# Altium footprint library Toi Library.PcbLib: 740 footprints (part 25 of 47)
Each footprint in its own frame and in the unit in brackets; x right, y up, seen from the top. Pads: shape width x height; smd on the part's side, far side on the other; paste and mask are expansions set on the pad; w line width, h text height; cw(c..) or ccw(c..) is an arc to the next point about the centre after c.
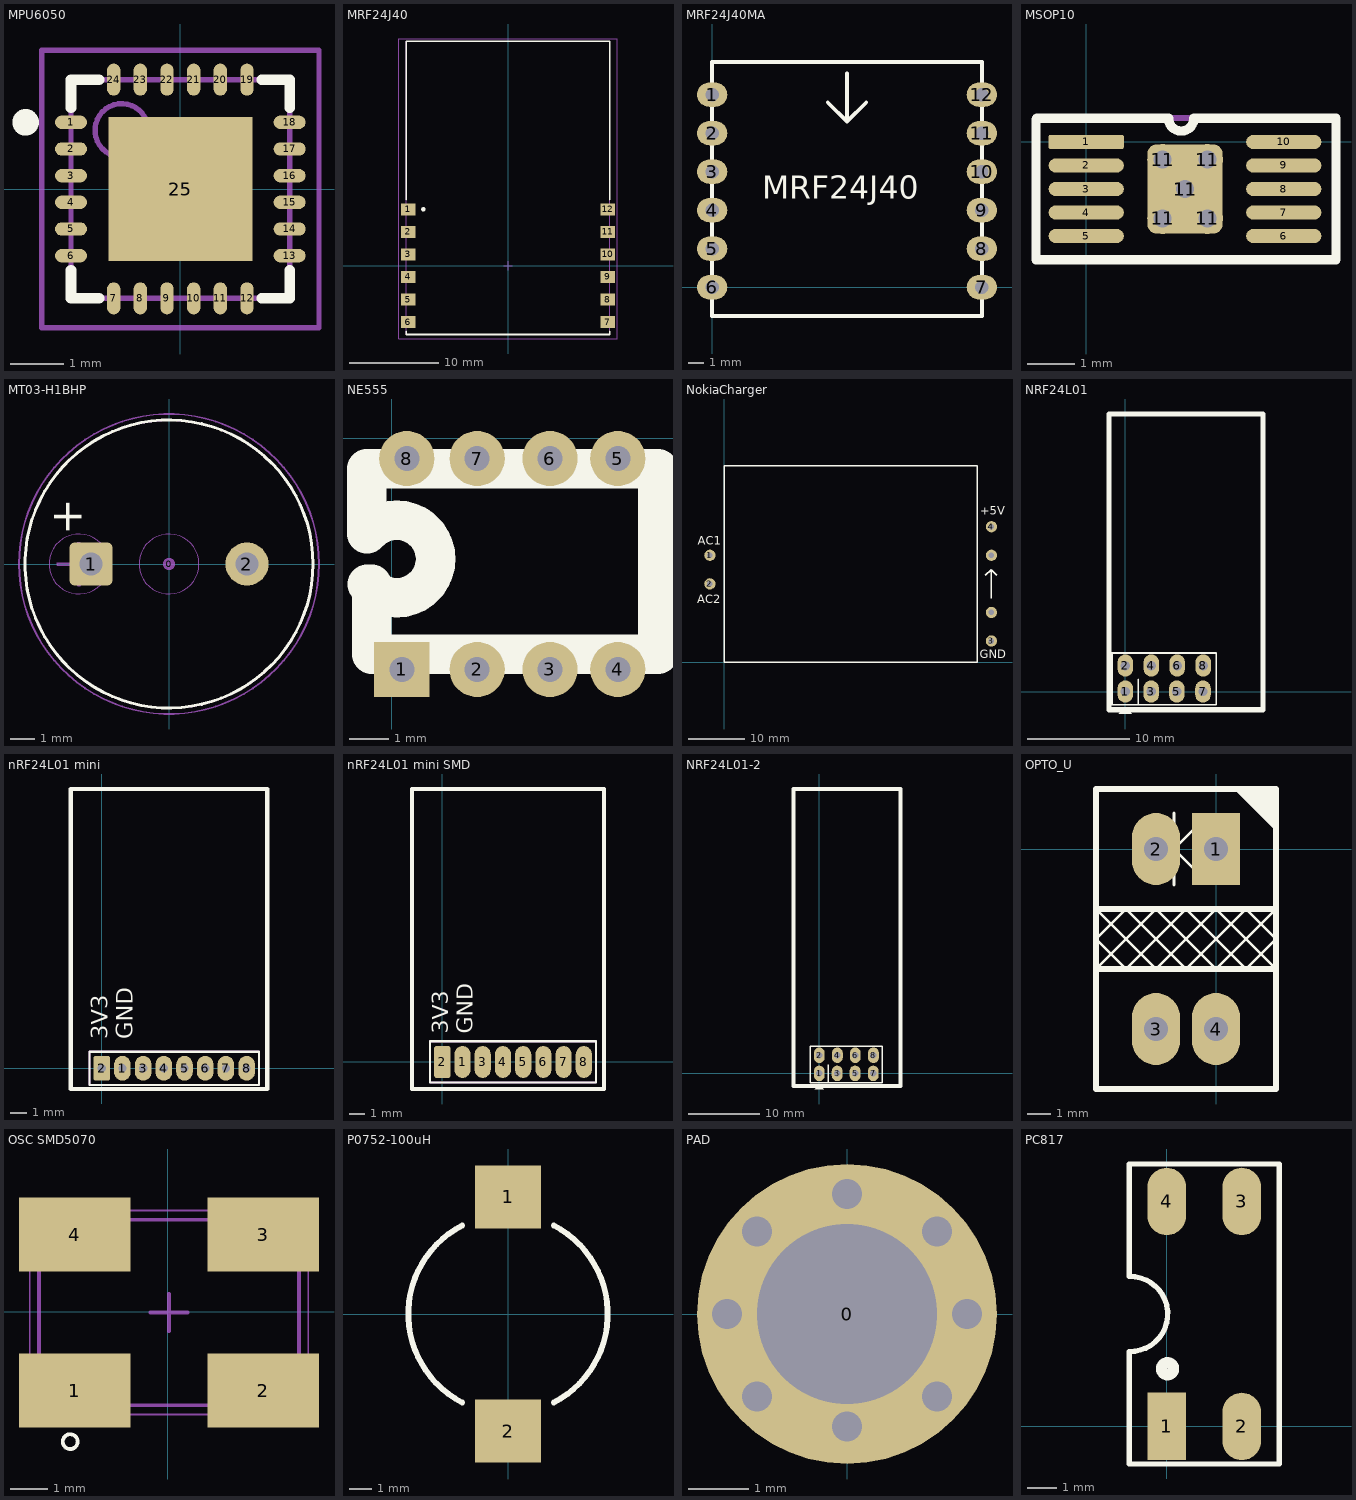
[diagram p24: the footprints below, top view; thin cyan lines are the x and y axes]

## MPU6050 [mm] "QFN-24N"
pads (25):
  oval 0.6x0.25 smd: 1(-2.05,1.25) 2(-2.05,0.75) 3(-2.05,0.25) 4(-2.05,-0.25) 5(-2.05,-0.75) 6(-2.05,-1.25) 13(2.05,-1.25) 14(2.05,-0.75) 15(2.05,-0.25) 16(2.05,0.25) 17(2.05,0.75) 18(2.05,1.25)
  oval 0.25x0.6 smd: 7(-1.25,-2.05) 8(-0.75,-2.05) 9(-0.25,-2.05) 10(0.25,-2.05) 11(0.75,-2.05) 12(1.25,-2.05) 19(1.25,2.05) 20(0.75,2.05) 21(0.25,2.05) 22(-0.25,2.05) 23(-0.75,2.05) 24(-1.25,2.05)
  rect 2.7x2.7 smd: 25(0,0)
Top Overlay:
  circle w0.25: c-2.9,1.25 r0.125
  lines w0.2: -2.05,-1.525 -2.05,-2.05 -1.525,-2.05 ; -2.05,1.525 -2.05,2.05 -1.525,2.05 ; 1.525,-2.05 2.05,-2.05 2.05,-1.525 ; 1.525,2.05 2.05,2.05 2.05,1.525
Mechanical 13:
  circle w0.1: c-1.1,1.1 r0.5
  lines w0.1: -2.05,-2.05 2.05,-2.05 2.05,2.05 -2.05,2.05 -2.05,-2.05
Mechanical 15:
  lines w0.1: -0.5,0 0.5,0 ; 0,-0.5 0,0.5 ; -2.6,-2.6 2.6,-2.6 2.6,2.6 -2.6,2.6 -2.6,-2.6
3D body "User Library-QFN24-0_5.STEP": height 1, standoff 0, extent -2,-2 2,2

## MRF24J40 [mm] "LCC, 12-Pins, Pitch 2.54mm, IPC Medium Density"
height 3.429
pads (12):
  rect 1.65x1.35 smd: 1(-11.225,6.35) 2(-11.225,3.81) 3(-11.225,1.27) 4(-11.225,-1.27) 5(-11.225,-3.81) 6(-11.225,-6.35) 7(11.225,-6.35) 8(11.225,-3.81) 9(11.225,-1.27) 10(11.225,1.27) 11(11.225,3.81) 12(11.225,6.35)
Top Overlay:
  circle w0.25: c-9.523,6.35 r0.125
  lines w0.2: -11.45,-7.425 -11.45,-7.747 11.45,-7.747 11.45,-7.425 ; -11.45,7.425 -11.45,25.273 0.195,25.273 ; -0.195,25.273 11.45,25.273 11.45,7.425
Mechanical 13:
  lines w0.1: -11.43,-7.747 -11.43,25.273 11.43,25.273 11.43,-7.747 -11.43,-7.747
Mechanical 15:
  lines w0.1: -0.5,0 0.5,0 ; 0,-0.5 0,0.5 ; -12.325,-8.255 12.325,-8.255 12.325,25.527 -12.325,25.527 -12.325,-8.255
3D body "User Library-MRF24J40MB-1.STEP": height 3.38, standoff 0.01, extent -11.43,-7.62 11.43,25.4

## MRF24J40MA [mm] "Microchip Zigbee Module"
pads (12):
  oval 2x1.6 hole 0.9: 1(0,12.7) 2(0,10.16) 3(0,7.62) 4(0,5.08) 5(0,2.54) 6(0,0) 7(17.78,0) 8(17.78,2.54) 9(17.78,5.08) 10(17.78,7.62) 11(17.78,10.16) 12(17.78,12.7)
Top Overlay:
  lines w0.254: 0,8.255 0,-1.905 ; 7.62,12.192 8.89,10.922 ; 8.89,14.097 8.89,10.922 ; 10.16,12.192 8.89,10.922 ; 0,-1.905 0,14.859 17.78,14.859 17.78,-1.905 0,-1.905
  text "MRF24J40" at 3.302,5.842 h1.52

## MSOP10 [mm]
pads (16):
  rrect25% 1.6x0.3 smd mask+0.05: 1(0,0)
  oval 1.6x0.3 smd mask+0.05: 2(0,-0.5) 3(0,-1) 4(0,-1.5) 5(0,-2) 6(4.2,-2) 7(4.2,-1.5) 8(4.2,-1) 9(4.2,-0.5) 10(4.2,0)
  round 0.66 hole 0.381: 11(1.625,-1.625) 11(1.625,-0.375) 11(2.1,-1) 11(2.575,-1.625) 11(2.575,-0.375)
  rrect25% 1.6x1.9 smd: 11(2.1,-1)
Top Overlay:
  lines w0.2: 1.725,0.5 -1.049,0.5 -1.067,0.483 -1.067,-2.5 5.309,-2.5 5.309,0.5 2.3,0.5 ; 1.75,0.5 ccw(c2.019,0.5) 2.289,0.5
Top Solder:
  rectangle: 1.175,-2.075 3.025,0.075
Mechanical 15:
  lines w0.127: -1.067,-2.489 5.309,-2.489 5.309,0.508 -1.067,0.508 -1.067,-2.489
3D body: height 1.1, standoff 0, extent 0.625,-2.5 3.625,0.525
3D body: height 0.15, standoff 0, extent -0.375,-2.125 4.6,0.125

## MT03-H1BHP [mm]
height 10.008
pads (3):
  round 0.508 on Mech15: 0(0,0)
  rrect25% 1.8x1.8 hole 0.965: 1(-3.25,0)
  round 1.8 hole 0.965: 2(3.25,0)
Top Overlay:
  circle w0.127: c0,0 r6
  text "+" at -3.2,1.2 h2.29
Mechanical 13:
  circle w0.076: c0.003,-0.012 r6
  circle w0.05: c0,0 r1.25
  circle w0.05: c0,0 r5.996
  circle w0.05: c-3.75,0 r1.25
  circle w0.05: c0,0 r6.25
  lines w0.05: -4.65,-0.05 -3.775,-0.05 ; -4.65,-0.05 -4.625,-0.025 ; -4.65,-0.05 -4.65,0.05 ; -4.65,0.05 -3.775,0.05 ; -4.65,0.05 -4.625,0.025 ; -4.625,-0.025 -3.8,-0.025 ; -4.625,-0.025 -4.625,0.025 ; -4.625,0.025 -3.8,0.025 ; -3.8,-0.9 -3.7,-0.9 ; -3.8,-0.9 -3.775,-0.875 ; -3.8,-0.9 -3.8,-0.025 ; -3.8,-0.025 cw(c-3.8,-0.05) -3.775,-0.05 ; -3.8,0.025 ccw(c-3.8,0.05) -3.775,0.05 ; -3.8,0.025 -3.8,0.9 ; -3.8,0.9 -3.775,0.875 ; -3.8,0.9 -3.7,0.9 ; -3.775,-0.875 -3.725,-0.875 ; -3.775,-0.875 -3.775,-0.05 ; -3.775,0.05 -3.775,0.875 ; -3.775,0.875 -3.725,0.875 ; -3.725,-0.875 -3.7,-0.9 ; -3.725,-0.875 -3.725,-0.05 ; -3.725,-0.05 cw(c-3.7,-0.05) -3.7,-0.025 ; -3.725,-0.05 -2.85,-0.05 ; -3.725,0.05 ccw(c-3.7,0.05) -3.7,0.025 ; -3.725,0.05 -2.85,0.05 ; -3.725,0.05 -3.725,0.875 ; -3.725,0.875 -3.7,0.9 ; -3.7,-0.9 -3.7,-0.025 ; -3.7,-0.025 -2.875,-0.025 ; -3.7,0.025 -3.7,0.9 ; -3.7,0.025 -2.875,0.025 ; -2.875,-0.025 -2.875,0.025 ; -2.875,-0.025 -2.85,-0.05 ; -2.875,0.025 -2.85,0.05 ; -2.85,-0.05 -2.85,0.05
Mechanical 15:
  circle w0.076: c0,0 r6.25
3D body: height 10, standoff -2.8, extent -6.249,-6.249 6.25,6.25

## NE555 [mm]
pads (8):
  rect 1.395x1.395 hole 0.635: 1(0.254,-5.842)
  round 1.395 hole 0.635: 2(2.159,-5.842) 3(4,-5.842) 4(5.715,-5.842) 5(5.715,-0.508) 6(4,-0.508) 7(2.159,-0.508) 8(0.381,-0.508)
Top Overlay:
  lines w1: -0.635,-2.413 -0.635,-0.762 6.731,-0.762 6.731,-1.937 6.731,-4.286 6.731,-5.461 -0.508,-5.461 -0.508,-3.683 ; -0.62,-3.683 ccw(c0.127,-3.048) -0.62,-2.413
3D body "User Library-NE55N.STEP": height 3.47, standoff -3.93, extent -0.825,-5.969 7.175,-0.398

## NokiaCharger [mm]
pads (6):
  round 2 hole 1: 1(-2.54,19.05) 2(-2.54,13.97) 3(47.54,3.81) 4(47.54,24.13) TEMP(47.54,8.89) TEMP(47.54,19.05)
Top Overlay:
  lines w0.254: 46.482,15.494 47.498,16.51 ; 47.498,11.43 47.498,16.51 ; 48.514,15.494 47.498,16.51 ; 0,0 0,35 ; 0,0 45,0 ; 0,0 45,0 ; 0,35 45,35 ; 0,35 45,35 ; 45,0 45,35
  text "GND" at 45.466,0.762 h1.52
  text "+5V" at 45.593,26.289 h1.52
  text "AC1" at -4.699,20.955 h1.52
  text "AC2" at -4.826,10.541 h1.52

## NRF24L01 [mil]
pads (8):
  oval 60x86 hole 36: 1(0,0) 2(0,100) 3(99,0) 4(100,100) 5(198,0) 6(199.5,100) 7(299,0) 8(300,100)
Top Overlay:
  region: -0.5,-61.5 -25.5,-86.5 24.5,-86.5
  lines w7: 49.5,-50.5 49.5,47.5 ; -51,-51 350,-51 350,149 -51,149 -51,49 -51,-51
  lines w20: -63,-70 530,-70 530,1069.2 -63,1069.2 -63,-70
3D body "User Library-MY-NRF24L01P.STEP": height 587.8, standoff 0.73, extent -73,-73.7 517.55,1068.03

## nRF24L01 mini [mil] "Connector; Header; 6 Position, 0.050\" pitch"
pads (8):
  oval 40x60 hole 20: 1(50,0) 3(100,0) 4(150,0) 5(200,0) 6(250,0) 7(300,0) 8(350,0)
  rrect25% 40x60 hole 20: 2(0,0)
Top Overlay:
  lines w5: -30,-40 380,-40 380,40 -30,40 -30,-40
  lines w10: -75,-50 -75,675 400,675 400,-50 -75,-50
  text "GND" at 75,70 h40
  text "3V3" at 15,70 h40
Bottom Solder:
  rectangle: 0,-30 350,30
Mechanical 13:
  lines w5: -30,-40 380,-40 380,40 -30,40 -30,-40

## nRF24L01 mini SMD [mm] "Connector; Header; 6 Position, 0.050\" pitch"
pads (8):
  oval 1.016x2 smd: 1(1.27,0) 3(2.54,0) 4(3.81,0) 5(5.08,0) 6(6.35,0) 7(7.62,0) 8(8.89,0)
  rrect25% 1.016x2 smd: 2(0,0)
Top Overlay:
  lines w0.127: -0.762,-1.3 9.652,-1.3 9.652,1.3 -0.762,1.3 -0.762,-1.3
  lines w0.254: -1.905,-1.7 -1.905,17.145 10.16,17.145 10.16,-1.7 -1.905,-1.7
  text "GND" at 1.905,1.778 h1.02
  text "3V3" at 0.381,1.778 h1.02
Bottom Solder:
  rectangle: 0,-0.762 8.89,0.762
Mechanical 13:
  lines w0.127: -0.762,-1.3 9.652,-1.3 9.652,1.3 -0.762,1.3 -0.762,-1.3

## NRF24L01-2 [mil]
pads (8):
  oval 60x86 hole 36: 1(0,0) 2(0,100) 3(99,0) 4(100,100) 5(198,0) 6(199.5,100) 7(299,0) 8(300,100)
Top Overlay:
  region: -0.5,-61.5 -25.5,-86.5 24.5,-86.5
  lines w7: 49.5,-50.5 49.5,47.5 ; -51,-51 350,-51 350,149 -51,149 -51,49 -51,-51
  lines w20: -143,-70 450,-70 450,1574.8 -143,1574.8 -143,-70

## OPTO_U [mil] "Opto hinh chu U"
height 104.33
pads (4):
  rect 80x120 hole 40: 1(0,0)
  oval 80x120 hole 40: 2(-100,0) 3(-100,-300) 4(0,-300)
Top Overlay:
  region: 97.5,97.5 32.5,97.5 97.5,32.5
  lines w5: -200,-200 -150,-150 -100,-100 0,-200 30,-170 100,-100 100,-200 0,-100 -100,-200 -110,-190 -140,-160 -200,-100 ; -70,-60 -70,60 ; -20,-50 -20,50 ; -20,-50 -20,50 ; -20,-50 -70,0 -20,50 ; -200,-150 -170,-180 -150,-200 -50,-100 50,-200 100,-150 50,-100 -50,-200 -150,-100 -200,-150
  lines w10: -200,-200 100,-200 ; -200,-150 -200,-110 ; -200,-100 100,-100 ; 100,-150 100,-140 ; -200,-400 100,-400 100,100 -200,100 -200,-400
3D body "SW3dPS-ee-sx-1041.STEP": height 394.3, standoff -196.25, extent -166,-430.59 70.22,120.59

## OSC SMD5070 [mm]
height 1.1
pads (4):
  rect 3x2 smd: 1(-2.504,-2.123) 2(2.576,-2.123) 3(2.576,2.077) 4(-2.504,2.077)
Top Overlay:
  circle w0.1: c-2.625,-3.5 r0.2
Mechanical 13:
  lines w0.1: -3.464,-2.523 -3.464,2.477 3.536,2.477 3.536,-2.523 -3.464,-2.523
Mechanical 15:
  lines w0.05: -3.714,-2.773 -3.714,2.727 3.786,2.727 3.786,-2.773 -3.714,-2.773
  lines w0.1: -0.464,-0.023 0.536,-0.023 ; 0.036,-0.523 0.036,0.477
3D body "User Library-cwx815.STEP": height 1, standoff -0.01, extent -3.614,-2.423 3.686,2.377

## P0752-100uH [mil]
pads (2):
  rect 115x110 smd: 1(0,205) 2(0,-205)
Top Overlay:
  lines w10: -80.14,-154.93 cw(c0,0) -80,155 ; 80,-155 ccw(c0,0) 80.14,154.93
3D body "SW3dPS-P0752.STEP": height 187.01, standoff 0, extent -182.09,-248.03 182.09,248.04

## PAD [mm]
pads (1):
  round 5 hole 3: 0(0,0)
via 0,2 diameter 0.508 hole 0.508
via 0,-1.875 diameter 0.508 hole 0.508
via 1.5,-1.375 diameter 0.508 hole 0.508
via 1.5,1.375 diameter 0.508 hole 0.508
via -1.5,-1.375 diameter 0.508 hole 0.508
via -1.5,1.375 diameter 0.508 hole 0.508
via 2,0 diameter 0.508 hole 0.508
via -2,0 diameter 0.508 hole 0.508

## PC817 [mm] "4 PIN, W 300mil, Pin to pin 100mil"
height 2.54
pads (4):
  rect 1.3x2.286 smd: 1(0,0)
  oval 1.3x2.286 smd: 2(2.54,0) 3(2.54,7.62) 4(0,7.62)
Top Overlay:
  circle w0.381: c0.025,1.956 r0.203
  lines w0.178: -1.28,2.541 ccw(c-1.237,3.81) -1.27,5.08 ; -1.27,2.54 -1.27,-1.27 3.81,-1.27 3.81,8.89 -1.27,8.89 -1.27,5.105
3D body "SW3DPS-DIP4-DEFAULT.STEP": height 4.31, standoff -3.28, extent -1.5,-0.254 4.04,7.746